# Altium footprint library mastermind.PCBLIB: 1061 footprints (part 35 of 67)
Each footprint in its own frame and in the unit in brackets; x right, y up, seen from the top. Pads: shape width x height; smd on the part's side, far side on the other; paste and mask are expansions set on the pad; w line width, h text height; cw(c..) or ccw(c..) is an arc to the next point about the centre after c.
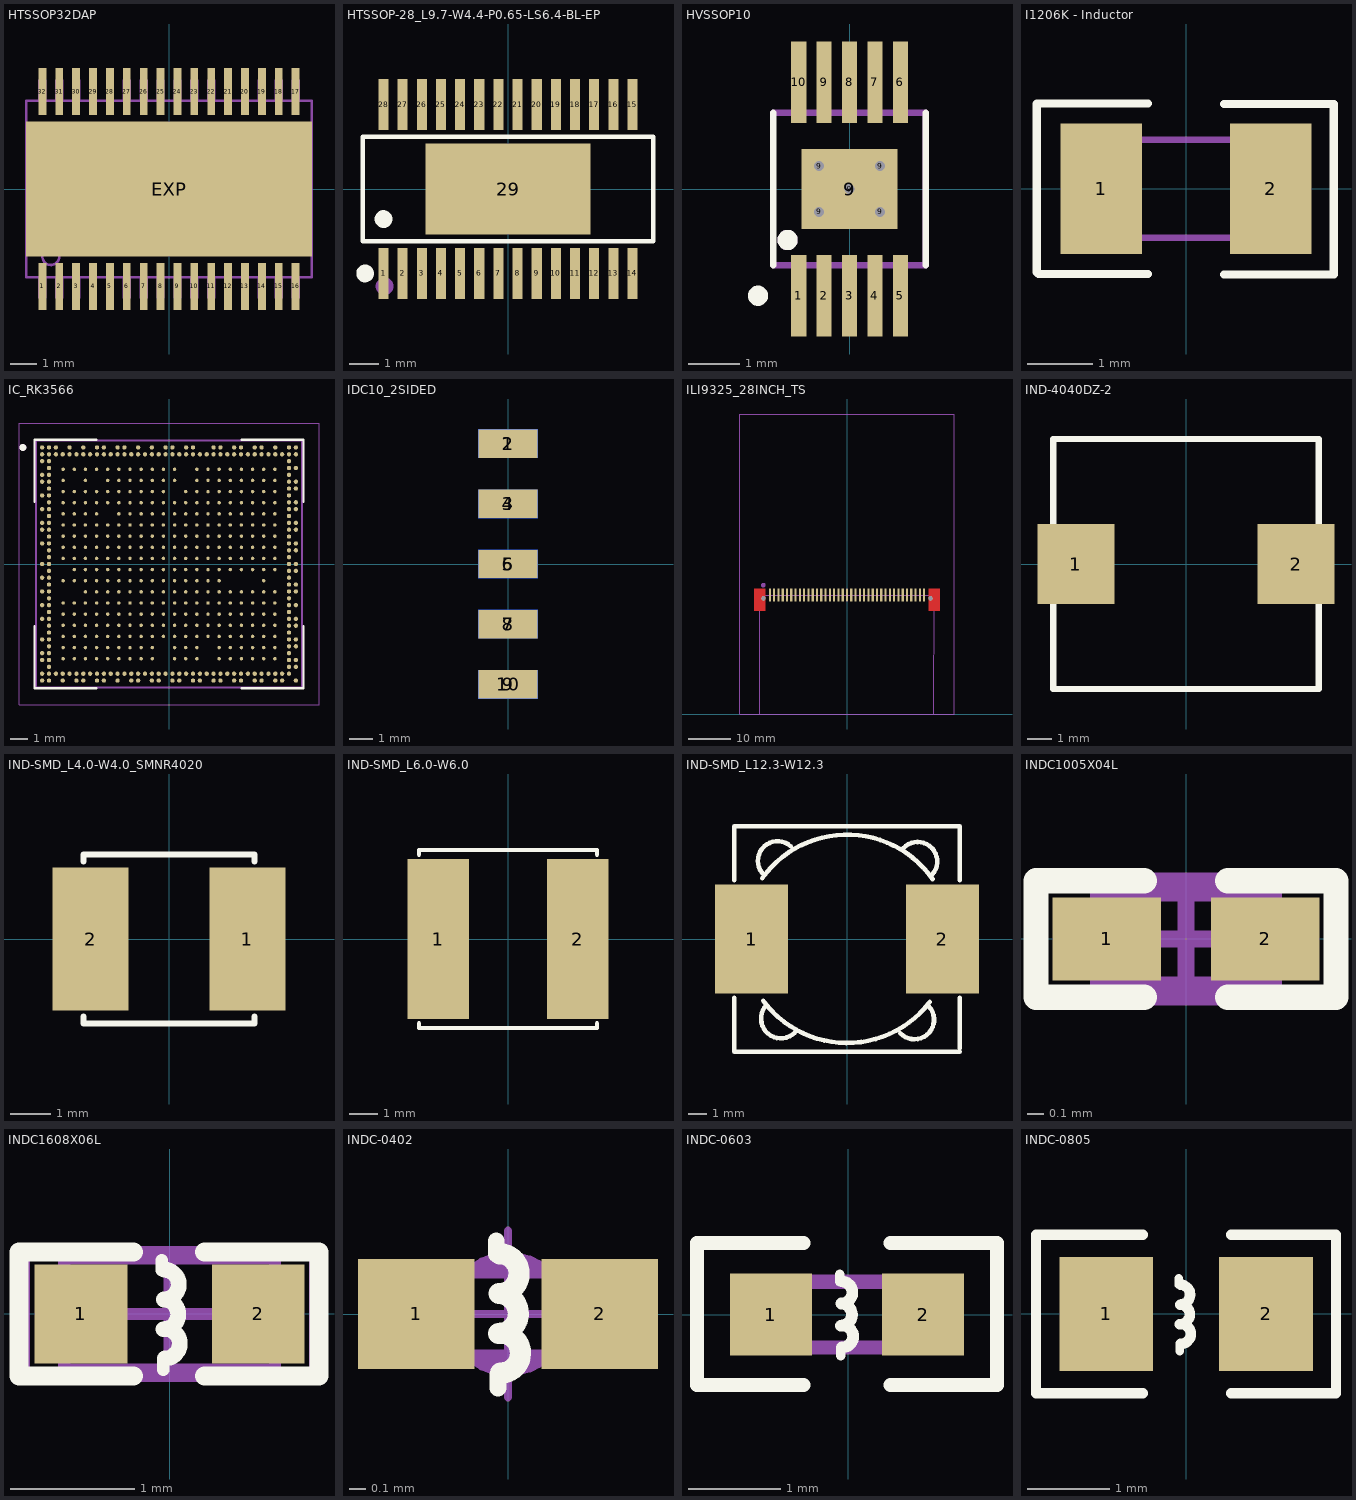
[diagram p34: the footprints below, top view; thin cyan lines are the x and y axes]

## HTSSOP32DAP [mm]
pads (33):
  rect 0.3x1.8 smd: 1(-4.875,-3.75) 2(-4.225,-3.75) 3(-3.575,-3.75) 4(-2.925,-3.75) 5(-2.275,-3.75) 6(-1.625,-3.75) 7(-0.975,-3.75) 8(-0.325,-3.75) 9(0.325,-3.75) 10(0.975,-3.75) 11(1.625,-3.75) 12(2.275,-3.75) 13(2.925,-3.75) 14(3.575,-3.75) 15(4.225,-3.75) 16(4.875,-3.75) 17(4.875,3.75) 18(4.225,3.75) 19(3.575,3.75) 20(2.925,3.75) 21(2.275,3.75) 22(1.625,3.75) 23(0.975,3.75) 24(0.325,3.75) 25(-0.325,3.75) 26(-0.975,3.75) 27(-1.625,3.75) 28(-2.275,3.75) 29(-2.925,3.75) 30(-3.575,3.75) 31(-4.225,3.75) 32(-4.875,3.75)
  rect 11x5.2 smd paste-5.5 mask-5.5: EXP(0,0)
Top Paste:
  region: -1.8,-1.2 -1.8,1.2 1.8,1.2 1.8,-1.2
Top Solder:
  region: 0,0 0.254,0 0.254,0.254 0,0.254
Mechanical 2:
  circle w0.102: c-4.55,-2.6 r0.325
  lines w0.102: -5.5,-3.4 -5.5,3.4 5.5,3.4 5.5,-3.4 -5.5,-3.4
Mechanical 8:
  region: -4.725,4.2 -4.725,3.45 -5.025,3.45 -5.025,4.2
  region: -4.075,4.2 -4.075,3.45 -4.375,3.45 -4.375,4.2
  region: -3.425,4.2 -3.425,3.45 -3.725,3.45 -3.725,4.2
  region: -2.775,4.2 -2.775,3.45 -3.075,3.45 -3.075,4.2
  region: -2.125,4.2 -2.125,3.45 -2.425,3.45 -2.425,4.2
  region: -1.475,4.2 -1.475,3.45 -1.775,3.45 -1.775,4.2
  region: -0.825,4.2 -0.825,3.45 -1.125,3.45 -1.125,4.2
  region: -0.175,4.2 -0.175,3.45 -0.475,3.45 -0.475,4.2
  region: 0.475,4.2 0.475,3.45 0.175,3.45 0.175,4.2
  region: 1.125,4.2 1.125,3.45 0.825,3.45 0.825,4.2
  region: 1.775,4.2 1.775,3.45 1.475,3.45 1.475,4.2
  region: 2.425,4.2 2.425,3.45 2.125,3.45 2.125,4.2
  region: 3.075,4.2 3.075,3.45 2.775,3.45 2.775,4.2
  region: 3.725,4.2 3.725,3.45 3.425,3.45 3.425,4.2
  region: 4.375,4.2 4.375,3.45 4.075,3.45 4.075,4.2
  region: 5.025,4.2 5.025,3.45 4.725,3.45 4.725,4.2
  region: 4.725,-4.2 4.725,-3.45 5.025,-3.45 5.025,-4.2
  region: 4.075,-4.2 4.075,-3.45 4.375,-3.45 4.375,-4.2
  region: 3.425,-4.2 3.425,-3.45 3.725,-3.45 3.725,-4.2
  region: 2.775,-4.2 2.775,-3.45 3.075,-3.45 3.075,-4.2
  region: 2.125,-4.2 2.125,-3.45 2.425,-3.45 2.425,-4.2
  region: 1.475,-4.2 1.475,-3.45 1.775,-3.45 1.775,-4.2
  region: 0.825,-4.2 0.825,-3.45 1.125,-3.45 1.125,-4.2
  region: 0.175,-4.2 0.175,-3.45 0.475,-3.45 0.475,-4.2
  region: -0.475,-4.2 -0.475,-3.45 -0.175,-3.45 -0.175,-4.2
  region: -1.125,-4.2 -1.125,-3.45 -0.825,-3.45 -0.825,-4.2
  region: -1.775,-4.2 -1.775,-3.45 -1.475,-3.45 -1.475,-4.2
  region: -2.425,-4.2 -2.425,-3.45 -2.125,-3.45 -2.125,-4.2
  region: -3.075,-4.2 -3.075,-3.45 -2.775,-3.45 -2.775,-4.2
  region: -3.725,-4.2 -3.725,-3.45 -3.425,-3.45 -3.425,-4.2
  region: -4.375,-4.2 -4.375,-3.45 -4.075,-3.45 -4.075,-4.2
  region: -5.025,-4.2 -5.025,-3.45 -4.725,-3.45 -4.725,-4.2

## HTSSOP-28_L9.7-W4.4-P0.65-LS6.4-BL-EP [mm]
pads (29):
  rect 0.343x1.731 smd: 1(-4.225,-2.866) 2(-3.575,-2.866) 3(-2.925,-2.866) 4(-2.275,-2.866) 5(-1.625,-2.866) 6(-0.975,-2.866) 7(-0.325,-2.866) 8(0.325,-2.866) 9(0.975,-2.866) 10(1.625,-2.866) 11(2.275,-2.866) 12(2.925,-2.866) 13(3.575,-2.866) 14(4.225,-2.866) 15(4.225,2.866) 16(3.575,2.866) 17(2.925,2.866) 18(2.275,2.866) 19(1.625,2.866) 20(0.975,2.866) 21(0.325,2.866) 22(-0.325,2.866) 23(-0.975,2.866) 24(-1.625,2.866) 25(-2.275,2.866) 26(-2.925,2.866) 27(-3.575,2.866) 28(-4.225,2.866)
  rect 5.6x3.1 smd: 29(0,0)
Top Overlay:
  circle w0.3: c-4.225,-1.019 r0.15
  circle w0.3: c-4.849,-2.866 r0.15
  lines w0.152: -4.926,-1.771 -4.926,1.772 4.926,1.772 4.926,-1.771 -4.926,-1.771
Mechanical 15:
  circle w0.3: c-4.191,-3.302 r0.15
3D body: height 1, standoff 0, extent -4.926,-1.771 4.926,1.772

## HVSSOP10 [mm]
pads (16):
  rect 0.3x1.6 smd paste-2 mask+0: 1(-1,-2.1) 2(-0.5,-2.1) 3(0,-2.1) 4(0.5,-2.1) 5(1,-2.1) 6(1,2.1) 7(0.5,2.1) 8(0,2.1) 9(-0.5,2.1) 10(-1,2.1)
  round 0.2 hole 0.2 mask+0: 9(-0.6,-0.45) 9(-0.6,0.45) 9(0,0) 9(0.6,-0.45) 9(0.6,0.45)
  rect 1.88x1.57 smd: 9(0,0)
Top Overlay:
  circle w0.2: c-1.8,-2.1 r0.1
  circle w0.2: c-1.219,-1.003 r0.1
  lines w0.127: -1.503,-1.497 -1.498,-0.294 -1.5,1.5 ; 1.5,-1.5 1.5,1.5
Top Paste:
  region: -0.875,2.875 -0.875,1.325 -1.125,1.325 -1.125,2.875
  region: -0.375,2.875 -0.375,1.325 -0.625,1.325 -0.625,2.875
  region: 0.125,2.875 0.125,1.325 -0.125,1.325 -0.125,2.875
  region: 0.625,2.875 0.625,1.325 0.375,1.325 0.375,2.875
  region: 1.125,2.875 1.125,1.325 0.875,1.325 0.875,2.875
  region: 1.125,-1.325 1.125,-2.875 0.875,-2.875 0.875,-1.325
  region: 0.625,-1.325 0.625,-2.875 0.375,-2.875 0.375,-1.325
  region: 0.125,-1.325 0.125,-2.875 -0.125,-2.875 -0.125,-1.325
  region: -0.375,-1.325 -0.375,-2.875 -0.625,-2.875 -0.625,-1.325
  region: -0.875,-1.325 -0.875,-2.875 -1.125,-2.875 -1.125,-1.325
Top Solder:
  region: -0.8,2.95 -0.8,1.25 -1.2,1.25 -1.2,2.95
  region: -0.3,2.95 -0.3,1.25 -0.7,1.25 -0.7,2.95
  region: 0.2,2.95 0.2,1.25 -0.2,1.25 -0.2,2.95
  region: 0.7,2.95 0.7,1.25 0.3,1.25 0.3,2.95
  region: 1.2,2.95 1.2,1.25 0.8,1.25 0.8,2.95
  region: 1.2,-1.25 1.2,-2.95 0.8,-2.95 0.8,-1.25
  region: 0.7,-1.25 0.7,-2.95 0.3,-2.95 0.3,-1.25
  region: 0.2,-1.25 0.2,-2.95 -0.2,-2.95 -0.2,-1.25
  region: -0.3,-1.25 -0.3,-2.95 -0.7,-2.95 -0.7,-1.25
  region: -0.8,-1.25 -0.8,-2.95 -1.2,-2.95 -1.2,-1.25
Mechanical 13:
  circle w0.2: c-1.219,-1.003 r0.1
  lines w0.127: -1.5,-1.5 1.5,-1.5 1.5,1.5 -1.5,1.5
3D body "step_temp.STEP": height 1.1, standoff 0, extent -1.5,-2.45 1.5,2.45

## I1206K - Inductor [mm]
pads (2):
  rect 1.25x2 smd: 1(-1.3,0) 2(1.3,0)
Top Overlay:
  lines w0.127: -0.584,-1.307 -2.263,-1.307 -2.287,-1.283 -2.287,1.303 -2.283,1.307 -0.584,1.307 ; 0.584,-1.317 2.27,-1.317 ; 0.584,1.297 2.27,1.297 ; 2.267,-1.29 2.267,1.29
Mechanical 8:
  region: -1.6,-0.8 -1.6,0.8 -1.1,0.8 -1.1,-0.8
  region: 1.1,-0.8 1.1,0.8 1.6,0.8 1.6,-0.8
  lines w0.102: -1.525,-0.75 1.525,-0.75 ; -1.525,0.75 1.525,0.75

## IC_RK3566 [mm]
height 0.904
pads (565):
  round 0.2 smd mask+0.05: 1A1(-6.175,5.525) 1A2(-5.525,5.525) 1A3(-4.875,5.525) 1A4(-4.225,5.525) 1A5(-3.575,5.525) 1A6(-2.925,5.525) 1A7(-2.275,5.525) 1A8(-1.625,5.525) 1A9(-0.975,5.525) 1A10(-0.325,5.525) 1A11(0.325,5.525) 1A13(1.625,5.525) 1A14(2.275,5.525) 1A15(2.925,5.525) 1A16(3.575,5.525) 1A17(4.225,5.525) 1A18(4.875,5.525) 1A19(5.525,5.525) 1A20(6.175,5.525) 1B1(-6.175,4.875) 1B3(-4.875,4.875) 1B5(-3.575,4.875) 1B6(-2.925,4.875) 1B7(-2.275,4.875) 1B8(-1.625,4.875) 1B9(-0.975,4.875) 1B10(-0.325,4.875) 1B11(0.325,4.875) 1B13(1.625,4.875) 1B14(2.275,4.875) 1B15(2.925,4.875) 1B16(3.575,4.875) 1B17(4.225,4.875) 1B18(4.875,4.875) 1B19(5.525,4.875) 1B20(6.175,4.875) 1C1(-6.175,4.225) 1C2(-5.525,4.225) 1C3(-4.875,4.225) 1C4(-4.225,4.225) 1C5(-3.575,4.225) 1C6(-2.925,4.225) 1C7(-2.275,4.225) 1C8(-1.625,4.225) 1C9(-0.975,4.225) 1C10(-0.325,4.225) 1C12(0.975,4.225) 1C13(1.625,4.225) 1C14(2.275,4.225) 1C15(2.925,4.225) 1C16(3.575,4.225) 1C17(4.225,4.225) 1C18(4.875,4.225) 1C19(5.525,4.225) 1C20(6.175,4.225) 1D1(-6.175,3.575) 1D2(-5.525,3.575) 1D3(-4.875,3.575) 1D4(-4.225,3.575) 1D5(-3.575,3.575) 1D6(-2.925,3.575) 1D7(-2.275,3.575) 1D8(-1.625,3.575) 1D9(-0.975,3.575) 1D10(-0.325,3.575) 1D11(0.325,3.575) 1D12(0.975,3.575) 1D13(1.625,3.575) 1D14(2.275,3.575) 1D15(2.925,3.575) 1D16(3.575,3.575) 1D17(4.225,3.575) 1D18(4.875,3.575) 1D19(5.525,3.575) 1D20(6.175,3.575) 1E1(-6.175,2.925) 1E2(-5.525,2.925) 1E3(-4.875,2.925) 1E4(-4.225,2.925) 1E6(-2.925,2.925) 1E7(-2.275,2.925) 1E8(-1.625,2.925) 1E9(-0.975,2.925) 1E10(-0.325,2.925) 1E11(0.325,2.925) 1E12(0.975,2.925) 1E13(1.625,2.925) 1E14(2.275,2.925) 1E15(2.925,2.925) 1E16(3.575,2.925) 1E17(4.225,2.925) 1E18(4.875,2.925) 1E19(5.525,2.925) 1E20(6.175,2.925) 1F1(-6.175,2.275) 1F2(-5.525,2.275) 1F3(-4.875,2.275) 1F4(-4.225,2.275) 1F5(-3.575,2.275) 1F6(-2.925,2.275) 1F7(-2.275,2.275) 1F8(-1.625,2.275) 1F9(-0.975,2.275) 1F10(-0.325,2.275) 1F11(0.325,2.275) 1F12(0.975,2.275) 1F13(1.625,2.275) 1F14(2.275,2.275) 1F15(2.925,2.275) 1F16(3.575,2.275) 1F17(4.225,2.275) 1F18(4.875,2.275) 1F19(5.525,2.275) 1F20(6.175,2.275) 1G1(-6.175,1.625) 1G2(-5.525,1.625) 1G3(-4.875,1.625) 1G4(-4.225,1.625) 1G5(-3.575,1.625) 1G6(-2.925,1.625) 1G7(-2.275,1.625) 1G8(-1.625,1.625) 1G9(-0.975,1.625) 1G10(-0.325,1.625) 1G11(0.325,1.625) 1G12(0.975,1.625) 1G13(1.625,1.625) 1G14(2.275,1.625) 1G15(2.925,1.625) 1G16(3.575,1.625) 1G17(4.225,1.625) 1G18(4.875,1.625) 1G19(5.525,1.625) 1G20(6.175,1.625) 1H1(-6.175,0.975) 1H2(-5.525,0.975) 1H3(-4.875,0.975) 1H4(-4.225,0.975) 1H5(-3.575,0.975) 1H6(-2.925,0.975) 1H7(-2.275,0.975) 1H8(-1.625,0.975) 1H9(-0.975,0.975) 1H10(-0.325,0.975) 1H11(0.325,0.975) 1H12(0.975,0.975) 1H13(1.625,0.975) 1H14(2.275,0.975) 1H15(2.925,0.975) 1H16(3.575,0.975) 1H17(4.225,0.975) 1H18(4.875,0.975) 1H19(5.525,0.975) 1H20(6.175,0.975) 1J1(-6.175,0.325) 1J2(-5.525,0.325) 1J3(-4.875,0.325) 1J4(-4.225,0.325) 1J5(-3.575,0.325) 1J6(-2.925,0.325) 1J7(-2.275,0.325) 1J8(-1.625,0.325) 1J9(-0.975,0.325) 1J10(-0.325,0.325) 1J11(0.325,0.325) 1J12(0.975,0.325) 1J13(1.625,0.325) 1J14(2.275,0.325) 1J15(2.925,0.325) 1J16(3.575,0.325) 1J17(4.225,0.325) 1J18(4.875,0.325) 1J19(5.525,0.325) 1J20(6.175,0.325) 1K2(-5.525,-0.325) 1K3(-4.875,-0.325) 1K4(-4.225,-0.325) 1K5(-3.575,-0.325) 1K6(-2.925,-0.325) 1K7(-2.275,-0.325) 1K8(-1.625,-0.325) 1K9(-0.975,-0.325) 1K10(-0.325,-0.325) 1K11(0.325,-0.325) 1K12(0.975,-0.325) 1K13(1.625,-0.325) 1K14(2.275,-0.325) 1K15(2.925,-0.325) 1K16(3.575,-0.325) 1K17(4.225,-0.325) 1K18(4.875,-0.325) 1K19(5.525,-0.325) 1K20(6.175,-0.325) 1L1(-6.175,-0.975) 1L2(-5.525,-0.975) 1L3(-4.875,-0.975) 1L4(-4.225,-0.975) 1L5(-3.575,-0.975) 1L6(-2.925,-0.975) 1L7(-2.275,-0.975) 1L8(-1.625,-0.975) 1L9(-0.975,-0.975) 1L10(-0.325,-0.975) 1L11(0.325,-0.975) 1L12(0.975,-0.975) 1L13(1.625,-0.975) 1L14(2.275,-0.975) 1L15(2.925,-0.975) 1L19(5.525,-0.975) 1M3(-4.875,-1.625) 1M4(-4.225,-1.625) 1M5(-3.575,-1.625) 1M6(-2.925,-1.625) 1M7(-2.275,-1.625) 1M8(-1.625,-1.625) 1M9(-0.975,-1.625) 1M10(-0.325,-1.625) 1M11(0.325,-1.625) 1M12(0.975,-1.625) 1M13(1.625,-1.625) 1M14(2.275,-1.625) 1M15(2.925,-1.625) 1M16(3.575,-1.625) 1M17(4.225,-1.625) 1M18(4.875,-1.625) 1M19(5.525,-1.625) 1M20(6.175,-1.625) 1N1(-6.175,-2.275) 1N2(-5.525,-2.275) 1N3(-4.875,-2.275) 1N4(-4.225,-2.275) 1N5(-3.575,-2.275) 1N6(-2.925,-2.275) 1N7(-2.275,-2.275) 1N8(-1.625,-2.275) 1N9(-0.975,-2.275) 1N10(-0.325,-2.275) 1N11(0.325,-2.275) 1N12(0.975,-2.275) 1N13(1.625,-2.275) 1N14(2.275,-2.275) 1N15(2.925,-2.275) 1N16(3.575,-2.275) 1N17(4.225,-2.275) 1N18(4.875,-2.275) 1N19(5.525,-2.275) 1N20(6.175,-2.275) 1P1(-6.175,-2.925) 1P2(-5.525,-2.925) 1P3(-4.875,-2.925) 1P4(-4.225,-2.925) 1P5(-3.575,-2.925) 1P6(-2.925,-2.925) 1P7(-2.275,-2.925) 1P8(-1.625,-2.925) 1P9(-0.975,-2.925) 1P10(-0.325,-2.925) 1P11(0.325,-2.925) 1P12(0.975,-2.925) 1P13(1.625,-2.925) 1P14(2.275,-2.925) 1P15(2.925,-2.925) 1P16(3.575,-2.925) 1P17(4.225,-2.925) 1P18(4.875,-2.925) 1P19(5.525,-2.925) 1P20(6.175,-2.925) 1R1(-6.175,-3.575) 1R2(-5.525,-3.575) 1R3(-4.875,-3.575) 1R4(-4.225,-3.575) 1R5(-3.575,-3.575) 1R6(-2.925,-3.575) 1R7(-2.275,-3.575) 1R8(-1.625,-3.575) 1R9(-0.975,-3.575) 1R10(-0.325,-3.575) 1R11(0.325,-3.575) 1R12(0.975,-3.575) 1R13(1.625,-3.575) 1R14(2.275,-3.575) 1R15(2.925,-3.575) 1R16(3.575,-3.575) 1R17(4.225,-3.575) 1R18(4.875,-3.575) 1R19(5.525,-3.575) 1R20(6.175,-3.575) 1T1(-6.175,-4.225) 1T2(-5.525,-4.225) 1T3(-4.875,-4.225) 1T4(-4.225,-4.225) 1T5(-3.575,-4.225) 1T6(-2.925,-4.225) 1T7(-2.275,-4.225) 1T8(-1.625,-4.225) 1T9(-0.975,-4.225) 1T10(-0.325,-4.225) 1T11(0.325,-4.225) 1T12(0.975,-4.225) 1T13(1.625,-4.225) 1T14(2.275,-4.225) 1T15(2.925,-4.225) 1T16(3.575,-4.225) 1T17(4.225,-4.225) 1T18(4.875,-4.225) 1T19(5.525,-4.225) 1T20(6.175,-4.225) 1U1(-6.175,-4.875) 1U2(-5.525,-4.875) 1U3(-4.875,-4.875) 1U4(-4.225,-4.875) 1U5(-3.575,-4.875) 1U6(-2.925,-4.875) 1U7(-2.275,-4.875) 1U8(-1.625,-4.875) 1U9(-0.975,-4.875) 1U11(0.325,-4.875) 1U12(0.975,-4.875) 1U13(1.625,-4.875) 1U15(2.925,-4.875) 1U16(3.575,-4.875) 1U17(4.225,-4.875) 1U18(4.875,-4.875) 1U19(5.525,-4.875) 1U20(6.175,-4.875) 1V1(-6.175,-5.525) 1V2(-5.525,-5.525) 1V3(-4.875,-5.525) 1V4(-4.225,-5.525) 1V5(-3.575,-5.525) 1V6(-2.925,-5.525) 1V7(-2.275,-5.525) 1V8(-1.625,-5.525) 1V9(-0.975,-5.525) 1V11(0.325,-5.525) 1V12(0.975,-5.525) 1V13(1.625,-5.525) 1V15(2.925,-5.525) 1V16(3.575,-5.525) 1V17(4.225,-5.525) 1V18(4.875,-5.525) 1V19(5.525,-5.525) 1V20(6.175,-5.525)
  round 0.25 smd mask+0.05: A1(-7.4,6.8) A2(-7,6.8) A3(-6.6,6.8) A5(-5.8,6.8) A7(-5,6.8) A9(-4.2,6.8) A10(-3.8,6.8) A12(-3,6.8) A13(-2.6,6.8) A15(-1.8,6.8) A17(-1,6.8) A19(-0.2,6.8) A20(0.2,6.8) A22(1,6.8) A23(1.4,6.8) A26(2.6,6.8) A27(3,6.8) A29(3.8,6.8) A30(4.2,6.8) A32(5,6.8) A33(5.4,6.8) A35(6.2,6.8) A37(7,6.8) A38(7.4,6.8) AA2(-7,-1.2) AA37(7,-1.2) AA38(7.4,-1.2) AB1(-7.4,-1.6) AB2(-7,-1.6) AB37(7,-1.6) AB38(7.4,-1.6) AC2(-7,-2) AC37(7,-2) AD1(-7.4,-2.4) AD2(-7,-2.4) AD37(7,-2.4) AD38(7.4,-2.4) AE2(-7,-2.8) AE37(7,-2.8) AF1(-7.4,-3.2) AF2(-7,-3.2) AF37(7,-3.2) AF38(7.4,-3.2) AG2(-7,-3.6) AG37(7,-3.6) AG38(7.4,-3.6) AH2(-7,-4) AH37(7,-4) AJ1(-7.4,-4.4) AJ2(-7,-4.4) AJ37(7,-4.4) AJ38(7.4,-4.4) AK2(-7,-4.8) AK37(7,-4.8) AK38(7.4,-4.8) AL1(-7.4,-5.2) AL2(-7,-5.2) AL37(7,-5.2) AM1(-7.4,-5.6) AM2(-7,-5.6) AM37(7,-5.6) AM38(7.4,-5.6) AN2(-7,-6) AN37(7,-6) AN38(7.4,-6) AP1(-7.4,-6.4) AP2(-7,-6.4) AP3(-6.6,-6.4) AP4(-6.2,-6.4) AP5(-5.8,-6.4) AP6(-5.4,-6.4) AP7(-5,-6.4) AP8(-4.6,-6.4) AP9(-4.2,-6.4) AP10(-3.8,-6.4) AP11(-3.4,-6.4) AP12(-3,-6.4) AP13(-2.6,-6.4) AP14(-2.2,-6.4) AP15(-1.8,-6.4) AP16(-1.4,-6.4) AP17(-1,-6.4) AP18(-0.6,-6.4) AP19(-0.2,-6.4) AP20(0.2,-6.4) AP21(0.6,-6.4) AP22(1,-6.4) AP23(1.4,-6.4) AP24(1.8,-6.4) AP25(2.2,-6.4) AP26(2.6,-6.4) AP27(3,-6.4) AP28(3.4,-6.4) AP29(3.8,-6.4) AP30(4.2,-6.4) AP31(4.6,-6.4) AP32(5,-6.4) AP33(5.4,-6.4) AP34(5.8,-6.4) AP35(6.2,-6.4) AP36(6.6,-6.4) AP37(7,-6.4) AR1(-7.4,-6.8) AR2(-7,-6.8) AR4(-6.2,-6.8) AR6(-5.4,-6.8) AR7(-5,-6.8) AR9(-4.2,-6.8) AR10(-3.8,-6.8) AR12(-3,-6.8) AR14(-2.2,-6.8) AR15(-1.8,-6.8) AR17(-1,-6.8) AR18(-0.6,-6.8) AR20(0.2,-6.8) AR21(0.6,-6.8) AR23(1.4,-6.8) AR24(1.8,-6.8) AR26(2.6,-6.8) AR27(3,-6.8) AR29(3.8,-6.8) AR30(4.2,-6.8) AR32(5,-6.8) AR33(5.4,-6.8) AR35(6.2,-6.8) AR36(6.6,-6.8) AR38(7.4,-6.8) B1(-7.4,6.4) B2(-7,6.4) B3(-6.6,6.4) B4(-6.2,6.4) B5(-5.8,6.4) B6(-5.4,6.4) B7(-5,6.4) B8(-4.6,6.4) B9(-4.2,6.4) B10(-3.8,6.4) B11(-3.4,6.4) B12(-3,6.4) B13(-2.6,6.4) B14(-2.2,6.4) B15(-1.8,6.4) B16(-1.4,6.4) B17(-1,6.4) B18(-0.6,6.4) B19(-0.2,6.4) B20(0.2,6.4) B21(0.6,6.4) B22(1,6.4) B23(1.4,6.4) B24(1.8,6.4) B25(2.2,6.4) B26(2.6,6.4) B27(3,6.4) B28(3.4,6.4) B29(3.8,6.4) B30(4.2,6.4) B31(4.6,6.4) B32(5,6.4) B33(5.4,6.4) B34(5.8,6.4) B35(6.2,6.4) B36(6.6,6.4) B37(7,6.4) B38(7.4,6.4) C1(-7.4,6) C2(-7,6) C37(7,6) D2(-7,5.6) D37(7,5.6) D38(7.4,5.6) E1(-7.4,5.2) E2(-7,5.2) E37(7,5.2) F1(-7.4,4.8) F2(-7,4.8) F37(7,4.8) F38(7.4,4.8) G2(-7,4.4) G37(7,4.4) G38(7.4,4.4) H1(-7.4,4) H2(-7,4) H37(7,4) J2(-7,3.6) J37(7,3.6) J38(7.4,3.6) K1(-7.4,3.2) K2(-7,3.2) K37(7,3.2) K38(7.4,3.2) L2(-7,2.8) L37(7,2.8) M1(-7.4,2.4) M2(-7,2.4) M37(7,2.4) M38(7.4,2.4) N1(-7.4,2) N2(-7,2) N37(7,2) N38(7.4,2) P2(-7,1.6) P37(7,1.6) R1(-7.4,1.2) R2(-7,1.2) R37(7,1.2) R38(7.4,1.2) T2(-7,0.8) T37(7,0.8) T38(7.4,0.8) U2(-7,0.4) U37(7,0.4) V1(-7.4,0) V2(-7,0) V37(7,0) V38(7.4,0) W2(-7,-0.4) W37(7,-0.4) W38(7.4,-0.4) Y1(-7.4,-0.8) Y2(-7,-0.8) Y37(7,-0.8)
Top Overlay:
  circle w0.2: c-8.525,6.8 r0.1
  lines w0.127: -7.845,-3.62 -7.845,-7.245 -4.22,-7.245 ; -7.845,3.62 -7.845,7.245 -4.22,7.245 ; 4.22,-7.245 7.845,-7.245 7.845,-3.62 ; 4.22,7.245 7.845,7.245 7.845,3.62
Mechanical 13:
  circle w0.2: c-8.525,6.8 r0.1
  lines w0.127: -7.75,-7.2 7.75,-7.2 7.75,7.2 -7.75,7.2 -7.75,-7.2
Mechanical 15:
  lines w0.05: -8.75,-8.2 8.75,-8.2 8.75,8.2 -8.75,8.2 -8.75,-8.2

## IDC10_2SIDED [mm]
pads (10):
  rect 2.5x1.2 smd: 1(0,5.08) 3(0,2.54) 5(0,0) 7(0,-2.54) 9(0,-5.08)
  rect 2.5x1.2 smd far side: 2(0,5.08) 4(0,2.54) 6(0,0) 8(0,-2.54) 10(0,-5.08)
3D body "IDC_5X2.STEP": height 4.13, standoff -4.67, extent -0.9,-10.55 10.9,10.09

## ILI9325_28INCH_TS [mm]
pads (39):
  round 1 hole 1: 1(-19.5,27) 1(19.5,27)
  rect 0.5x3 smd: 1(-18,27.77) 2(-17,27.77) 3(-16,27.77) 4(-15,27.77) 5(-14,27.77) 6(-13,27.77) 7(-12,27.77) 8(-11,27.77) 9(-10,27.77) 10(-9,27.77) 11(-8,27.77) 12(-7,27.77) 13(-6,27.77) 14(-5,27.77) 15(-4,27.77) 16(-3,27.77) 17(-2,27.77) 18(-1,27.77) 19(0,27.77) 20(1,27.77) 21(2,27.77) 22(3,27.77) 23(4,27.77) 24(5,27.77) 25(6,27.77) 26(7,27.77) 27(8,27.77) 28(9,27.77) 29(10,27.77) 30(11,27.77) 31(12,27.77) 32(13,27.77) 33(14,27.77) 34(15,27.77) 35(16,27.77) 36(17,27.77) 37(18,27.77)
Top Layer:
  region: 19.05,24.13 19.05,29.21 21.59,29.21 21.59,24.13
  region: -21.59,24.13 -21.59,29.21 -19.05,29.21 -19.05,24.13
Top Solder:
  region: 19.05,24.13 19.05,29.21 21.59,29.21 21.59,24.13
  region: -21.59,24.13 -21.59,29.21 -19.05,29.21 -19.05,24.13
Mechanical 2:
  circle w0.61: c-19.534,30.054 r0.254
  lines w0.127: -20.4,0 -25,0 -25,70 25,70 25,0 20.3,0 ; -20.4,0 20.3,0 ; -20.4,0 -20.4,27.686 20.4,27.686 20.3,0

## IND-4040DZ-2 [mm] "1.8 µH and above"
height 4
pads (2):
  rect 3.124x3.251 smd: 1(-4.47,0) 2(4.47,0)
Top Overlay:
  lines w0.254: -5.397,-5.08 -5.397,5.08 5.397,5.08 5.397,-5.08 -5.397,-5.08
3D body "IHLP_SMD_4040_10uH.stp": height 3.83, standoff -0.05, extent -5.325,-5.058 5.297,5.158

## IND-SMD_L4.0-W4.0_SMNR4020 [mm]
pads (2):
  rect 1.874x3.52 smd paste+0 mask+0.051: 1(1.928,0) 2(-1.928,0)
Top Overlay:
  lines w0.152: -2.101,-1.912 -2.101,-2.076 2.101,-2.076 2.101,-1.912 ; -2.101,1.912 -2.101,2.076 2.101,2.076 2.101,1.912
3D body "NR4018.STEP": height 1.8, standoff 0, extent -2,-2 2,2

## IND-SMD_L6.0-W6.0 [mm]
pads (2):
  rect 2.2x5.72 smd paste+0 mask+0.051: 1(-2.5,0) 2(2.5,0)
Top Overlay:
  lines w0.152: -3.176,-3.012 -3.176,-3.176 3.176,-3.176 3.176,-3.012 ; -3.176,3.012 -3.176,3.176 3.176,3.176 3.176,3.012

## IND-SMD_L12.3-W12.3 [mm]
pads (2):
  rect 4x6 smd: 1(-5.25,0) 2(5.25,0)
Top Overlay:
  lines w0.254: -6.2,-3.231 -6.2,-6.2 6.2,-6.2 ; -6.2,3.231 -6.2,6.2 6.2,6.2 6.2,3.231 ; -4.666,3.348 cw(c0,0) 4.7,3.3 ; -4.6,-3.4 ccw(c0,0) 4.552,-3.464 ; -4.55,3.504 cw(c-3.822,4.299) -3.1,5.1 ; -4.534,-3.759 ccw(c-3.641,-4.378) -2.758,-5.011 ; 2.927,-5.176 ccw(c3.711,-4.435) 4.5,-3.7 ; 3.087,4.988 cw(c3.882,4.26) 4.683,3.538 ; 6.2,-6 6.2,-3.231

## INDC1005X04L [mm]
pads (2):
  rect 0.65x0.5 smd: 1(-0.475,0) 2(0.475,0)
Top Overlay:
  lines w0.152: -0.25,-0.35 -0.9,-0.35 -0.9,0.35 -0.25,0.35 ; 0.25,-0.35 0.9,-0.35 0.9,0.35 0.25,0.35
Mechanical 13:
  lines w0.1: -0.525,-0.275 -0.525,0.275 0.525,0.275 0.525,-0.275 -0.525,-0.275
Mechanical 15:
  lines w0.1: -0.275,0 0.275,0 ; 0,-0.275 0,0.275 ; -0.9,-0.35 -0.9,0.35 0.9,0.35 0.9,-0.35 -0.9,-0.35
3D body "User Library-Chip Inductor 0402.step": height 0.5, standoff 0, extent -0.5,-0.3 0.5,0.3

## INDC1608X06L [mm]
pads (2):
  rect 0.75x0.8 smd: 1(-0.715,0) 2(0.715,0)
Top Overlay:
  lines w0.1: -0.063,0.353 -0.063,0.435 ; -0.053,-0.449 -0.053,-0.368
  lines w0.127: -0.05,-0.122 ccw(c-0.05,-0.002) -0.046,0.117 ccw(c-0.046,0.237) -0.042,0.357 ; -0.038,-0.359 ccw(c-0.038,-0.239) -0.033,-0.119
  lines w0.152: -0.29,-0.5 -1.215,-0.5 -1.215,0.5 -0.29,0.5 ; 0.28,-0.5 1.205,-0.5 1.205,0.5 0.28,0.5
Mechanical 13:
  lines w0.1: -0.85,-0.45 0.85,-0.45 0.85,0.45 -0.85,0.45 -0.85,-0.45
Mechanical 15:
  lines w0.1: -0.45,0 0.45,0 ; 0,-0.45 0,0.45 ; -1.175,-0.5 -1.175,0.5 1.175,0.5 1.175,-0.5 -1.175,-0.5
3D body "User Library-Chip Inductor.step": height 0.8, standoff 0, extent -0.8,-0.475 0.8,0.475

## INDC-0402 [mm]
pads (2):
  rect 0.7x0.66 smd: 1(-0.55,0) 2(0.55,0)
Top Overlay:
  lines w0.1: -0.07,0.358 -0.07,0.439 ; -0.06,-0.445 -0.06,-0.363
  lines w0.127: -0.058,-0.118 ccw(c-0.058,0.002) -0.053,0.122 ccw(c-0.053,0.242) -0.049,0.362 ; -0.045,-0.354 ccw(c-0.045,-0.234) -0.041,-0.115
Top Component Center:
  circle w0.05: c0,0 r0.35
  lines w0.05: -0.5,0 0.5,0 ; 0,-0.5 0,0.5
Top 3D Body:
  lines w0.001: -0.5,-0.25 -0.5,0.25 0.5,0.25 0.5,-0.25 -0.5,-0.25
Top Dimensions:
  lines w0.1: -0.512,-0.262 -0.512,0.262 0.512,0.262 0.512,-0.262 -0.512,-0.262
Top Assembly:
  text ".Designator" at -1.4,0.88 h0.75
3D body "User Library-CAPC1005X06.step": height 0.6, standoff 0, extent -0.5,-0.25 0.5,0.25

## INDC-0603 [mil]
pads (2):
  rect 35x35 smd: 1(-33,0) 2(32,0)
Top Overlay:
  lines w3.94: -3.61,14 -3.61,17.22 ; -3.21,-17.6 -3.21,-14.38
  lines w5: -3.11,-4.72 ccw(c-3.11,0) -2.94,4.72 ccw(c-2.94,9.45) -2.77,14.17 ; -2.61,-14.04 ccw(c-2.61,-9.32) -2.44,-4.59
  lines w5.98: -19,-30 -64.5,-30 -64.5,30.5 -19,30.5 ; 18,-30 63.5,-30 63.5,30.5 18,30.5
Mechanical 8:
  region: 16.5,-17.02 16.5,16.98 32.5,16.98 32.5,-17.02
  region: -33.5,-17.02 -33.5,16.98 -17.5,16.98 -17.5,-17.02
  lines w6: -17.51,-14.04 16.51,-14.04 ; -17.51,14 16.51,14
3D body "User Library-R_0603.STEP": height 19.68, standoff 0, extent -31.49,-17.71 31.5,17.72

## INDC-0805 [mm]
pads (2):
  rect 1.133x1.377 smd: 1(-0.966,0) 2(0.966,0)
Top Overlay:
  lines w0.1: -0.089,0.35 -0.089,0.432 ; -0.079,-0.453 -0.079,-0.371
  lines w0.127: -0.523,-0.961 -1.816,-0.961 -1.816,0.96 -0.523,0.96 ; -0.076,-0.126 ccw(c-0.076,-0.006) -0.072,0.114 ccw(c-0.072,0.234) -0.068,0.354 ; -0.064,-0.362 ccw(c-0.063,-0.242) -0.059,-0.122 ; 0.548,-0.961 1.813,-0.961 1.813,0.96 0.548,0.96
Top Paste:
  region: 0.36,-0.22 0.36,0.22 0.745,0.689 1.433,0.689 1.533,0.589 1.533,-0.588 1.433,-0.688 0.745,-0.688
  region: -0.36,-0.22 -0.36,0.22 -0.745,0.689 -1.433,0.689 -1.533,0.589 -1.533,-0.588 -1.433,-0.688 -0.745,-0.688